# Altium footprint library PcbLib_ICs.PcbLib: 317 footprints (part 23 of 24)
Each footprint in its own frame and in the unit in brackets; x right, y up, seen from the top. Pads: shape width x height; smd on the part's side, far side on the other; paste and mask are expansions set on the pad; w line width, h text height; cw(c..) or ccw(c..) is an arc to the next point about the centre after c.
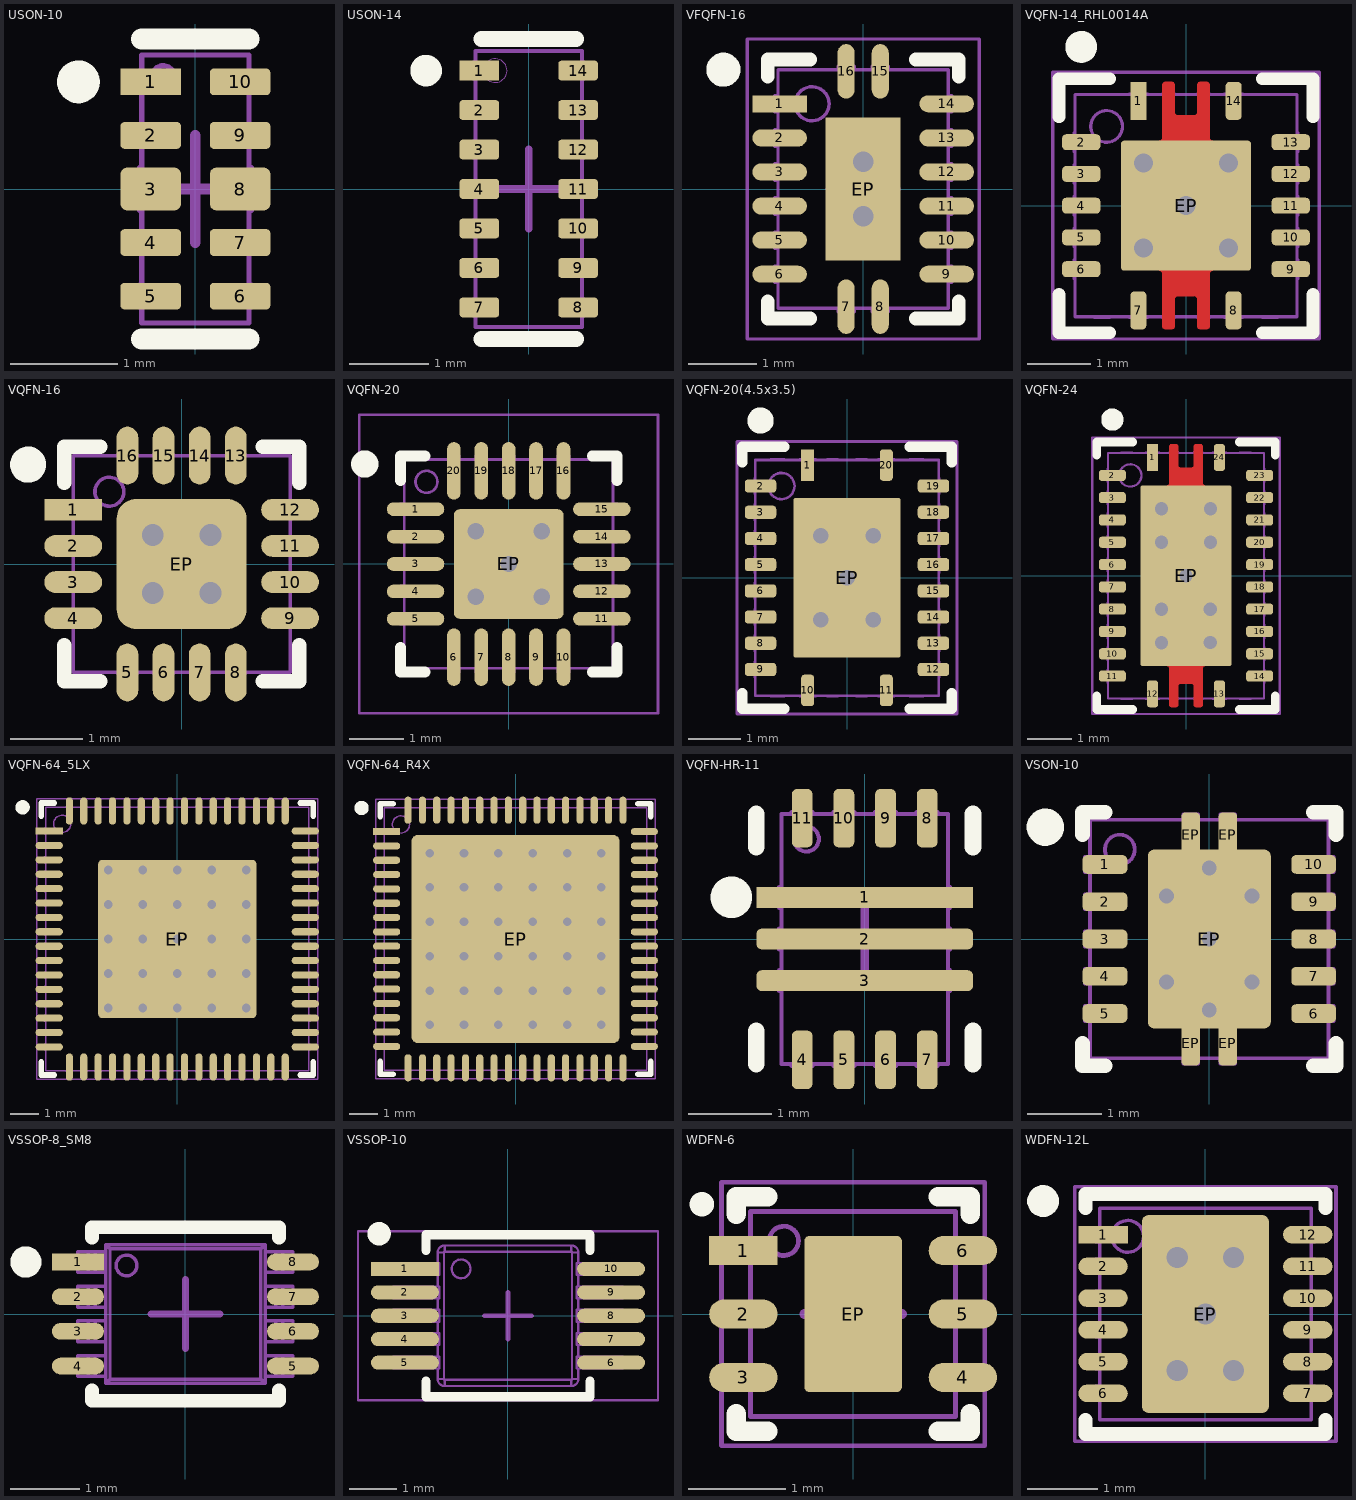
[diagram p22: the footprints below, top view; thin cyan lines are the x and y axes]

## USON-10 [mm] "USON-10 package. Ref DQA0010A TI"
height 0.43
pads (10):
  rect 0.565x0.25 smd paste+0 mask+0.05: 1(-0.417,1)
  rrect30% 0.565x0.25 smd paste+0 mask+0.05: 2(-0.417,0.5) 4(-0.417,-0.5) 5(-0.417,-1) 6(0.417,-1) 7(0.417,-0.5) 9(0.417,0.5) 10(0.417,1)
  rrect30% 0.565x0.4 smd paste+0 mask+0.05: 3(-0.417,0) 8(0.417,0)
Top Overlay:
  circle w0.2: c-1.092,1 r0.1
  lines w0.2: -0.5,-1.4 0.5,-1.4 ; -0.5,1.4 0.5,1.4
Top Assy:
  circle w0.05: c-0.3,1.05 r0.1
  lines w0.05: -0.5,-1.1 -0.52,-1.1 -0.52,-0.9 -0.5,-0.9 ; -0.5,-0.6 -0.52,-0.6 -0.52,-0.4 -0.5,-0.4 ; -0.5,-0.2 -0.52,-0.2 -0.52,0.2 -0.5,0.2 ; -0.5,0.4 -0.52,0.4 -0.52,0.6 -0.5,0.6 ; -0.5,0.9 -0.52,0.9 -0.52,1.1 -0.5,1.1 ; 0.5,-1.1 0.52,-1.1 0.52,-0.9 0.5,-0.9 ; 0.5,-0.6 0.52,-0.6 0.52,-0.4 0.5,-0.4 ; 0.5,-0.2 0.52,-0.2 0.52,0.2 0.5,0.2 ; 0.5,0.4 0.52,0.4 0.52,0.6 0.5,0.6 ; 0.5,0.9 0.52,0.9 0.52,1.1 0.5,1.1 ; -0.5,-1.25 -0.5,1.25 0.5,1.25 0.5,-1.25 -0.5,-1.25
  text ".Designator" at 0.233,-1.719 h1
Top Text:
  lines w0.1: -0.5,0 0.5,0 ; 0,-0.5 0,0.5
3D body "USON-10.STEP": height 0.55, standoff 0, extent -0.52,-1.25 0.52,1.25

## USON-14 [mm] "USON-14 package"
height 0.43
pads (14):
  rect 0.5x0.25 smd paste+0 mask+0.05: 1(-0.625,1.5)
  rrect30% 0.5x0.25 smd paste+0 mask+0.05: 2(-0.625,1) 3(-0.625,0.5) 4(-0.625,0) 5(-0.625,-0.5) 6(-0.625,-1) 7(-0.625,-1.5) 8(0.625,-1.5) 9(0.625,-1) 10(0.625,-0.5) 11(0.625,0) 12(0.625,0.5) 13(0.625,1) 14(0.625,1.5)
Top Overlay:
  circle w0.2: c-1.3,1.5 r0.1
  lines w0.2: -0.6,-1.9 0.6,-1.9 ; -0.6,1.9 0.6,1.9
Top Assy:
  circle w0.013: c-0.425,1.5 r0.15
  lines w0.05: -0.675,-1.6 -0.7,-1.6 -0.7,-1.4 -0.675,-1.4 ; -0.675,-1.1 -0.7,-1.1 -0.7,-0.9 -0.675,-0.9 ; -0.675,-0.6 -0.7,-0.6 -0.7,-0.4 -0.675,-0.4 ; -0.675,-0.1 -0.7,-0.1 -0.7,0.1 -0.675,0.1 ; -0.675,0.4 -0.7,0.4 -0.7,0.6 -0.675,0.6 ; -0.675,0.9 -0.7,0.9 -0.7,1.1 -0.675,1.1 ; -0.675,1.4 -0.7,1.4 -0.7,1.6 -0.675,1.6 ; 0.675,-1.6 0.7,-1.6 0.7,-1.4 0.675,-1.4 ; 0.675,-1.1 0.7,-1.1 0.7,-0.9 0.675,-0.9 ; 0.675,-0.6 0.7,-0.6 0.7,-0.4 0.675,-0.4 ; 0.675,-0.1 0.7,-0.1 0.7,0.1 0.675,0.1 ; 0.675,0.4 0.7,0.4 0.7,0.6 0.675,0.6 ; 0.675,0.9 0.7,0.9 0.7,1.1 0.675,1.1 ; 0.675,1.4 0.7,1.4 0.7,1.6 0.675,1.6 ; -0.675,-1.75 -0.675,1.75 0.675,1.75 0.675,-1.75 -0.675,-1.75
  text ".Designator" at 0.233,-1.719 h1
Top Text:
  lines w0.1: -0.5,0 0.5,0 ; 0,-0.5 0,0.5
3D body "USON-14.STEP": height 0.55, standoff 0, extent -0.7,-1.75 0.7,1.75

## VFQFN-16 [mm] "QFN, 16-Leads, Body 2.50x3.50mm, Pitch 0.50mm, Thermal Pad 1.00x2.00mm, IPC Medium Density"
height 1
pads (17):
  rect 0.8x0.25 smd mask+0.05: 1(-1.225,1.25)
  oval 0.8x0.25 smd mask+0.05: 2(-1.225,0.75) 3(-1.225,0.25) 4(-1.225,-0.25) 5(-1.225,-0.75) 6(-1.225,-1.25) 9(1.225,-1.25) 10(1.225,-0.75) 11(1.225,-0.25) 12(1.225,0.25) 13(1.225,0.75) 14(1.225,1.25)
  oval 0.25x0.8 smd mask+0.05: 7(-0.25,-1.725) 8(0.25,-1.725) 15(0.25,1.725) 16(-0.25,1.725)
  rect 1.1x2.1 smd paste-3 mask+0.05: EP(0,0)
via 0,-0.4 diameter 0.7 hole 0.3
via 0,0.4 diameter 0.7 hole 0.3
Top Overlay:
  circle w0.25: c-2.05,1.75 r0.125
  lines w0.2: -1.4,-1.65 -1.4,-1.9 -0.775,-1.9 ; -1.4,1.65 -1.4,1.9 -0.775,1.9 ; 0.775,-1.9 1.4,-1.9 1.4,-1.65 ; 0.775,1.9 1.4,1.9 1.4,1.65
Top Paste:
  rectangle: -0.6,0.45 -0.1,0.95
  rectangle: 0.1,0.45 0.6,0.95
  region: -0.1,0.25 -0.6,0.25 -0.6,-0.25 -0.1,-0.25
  rectangle: 0.1,-0.25 0.6,0.25
  region: -0.1,-0.45 -0.6,-0.45 -0.6,-0.95 -0.1,-0.95
  rectangle: 0.1,-0.95 0.6,-0.45
Bottom Solder:
  region: -0.75,1.25 -0.25,1.25 0,1 0.25,1.25 0.75,1.25 0.75,0.25 0.5,0 0.75,-0.25 0.75,-1.25 0.25,-1.25 0,-1 -0.25,-1.25 -0.75,-1.25 -0.75,-0.25 -0.5,0 -0.75,0.25
Top Assy:
  circle w0.05: c-0.75,1.25 r0.25
  lines w0.05: -1.25,-1.37 -1.3,-1.37 -1.3,-1.13 -1.25,-1.13 ; -1.25,-0.87 -1.3,-0.87 -1.3,-0.63 -1.25,-0.63 ; -1.25,-0.37 -1.3,-0.37 -1.3,-0.13 -1.25,-0.13 ; -1.25,0.13 -1.3,0.13 -1.3,0.37 -1.25,0.37 ; -1.25,0.63 -1.3,0.63 -1.3,0.87 -1.25,0.87 ; -1.25,1.13 -1.3,1.13 -1.3,1.37 -1.25,1.37 ; -0.37,-1.75 -0.37,-1.8 -0.13,-1.8 -0.13,-1.75 ; -0.37,1.75 -0.37,1.8 -0.13,1.8 -0.13,1.75 ; 0.13,-1.75 0.13,-1.8 0.37,-1.8 0.37,-1.75 ; 0.13,1.75 0.13,1.8 0.37,1.8 0.37,1.75 ; 1.25,-1.37 1.3,-1.37 1.3,-1.13 1.25,-1.13 ; 1.25,-0.87 1.3,-0.87 1.3,-0.63 1.25,-0.63 ; 1.25,-0.37 1.3,-0.37 1.3,-0.13 1.25,-0.13 ; 1.25,0.13 1.3,0.13 1.3,0.37 1.25,0.37 ; 1.25,0.63 1.3,0.63 1.3,0.87 1.25,0.87 ; 1.25,1.13 1.3,1.13 1.3,1.37 1.25,1.37 ; -1.25,-1.75 -1.25,1.75 1.25,1.75 1.25,-1.75 -1.25,-1.75
Top Text:
  lines w0.05: -1.7,-2.2 -1.7,2.2 1.7,2.2 1.7,-2.2 -1.7,-2.2
  lines w0.1: -0.5,0 0.5,0 ; 0,-0.5 0,0.5
3D body "DHVQFN16.STEP": height 0.97, standoff -0.03, extent -1.3,-1.8 1.3,1.8

## VQFN-14_RHL0014A [mm] "VQFN-24 package 5.5x3.5mm with 0.5mm pitch"
height 0.75
pads (15):
  rect 0.25x0.6 smd paste+0 mask+0.05: 1(-0.75,1.65)
  rrect50% 0.6x0.25 smd paste+0 mask+0.05: 2(-1.65,1) 3(-1.65,0.5) 4(-1.65,0) 5(-1.65,-0.5) 6(-1.65,-1) 9(1.65,-1) 10(1.65,-0.5) 11(1.65,0) 12(1.65,0.5) 13(1.65,1)
  rrect50% 0.25x0.6 smd paste+0 mask+0.05: 7(-0.75,-1.65) 8(0.75,-1.65) 14(0.75,1.65)
  rrect5% 2.05x2.05 smd paste-10 mask+0.05: EP(0,0)
via 0.67,-0.67 diameter 0.7 hole 0.3
via -0.67,-0.67 diameter 0.7 hole 0.3
via -0.67,0.67 diameter 0.7 hole 0.3
via 0.67,0.67 diameter 0.7 hole 0.3
via 0,0 diameter 0.7 hole 0.3
Top Layer:
  region: -0.375,1.9 -0.375,1.91 -0.367,1.928 -0.353,1.942 -0.335,1.95 -0.325,1.95 -0.225,1.95 -0.215,1.95 -0.197,1.942 -0.183,1.928 -0.175,1.91 -0.175,1.9 -0.175,1.475 -0.174,1.465 -0.167,1.447 -0.153,1.433 -0.135,1.426 -0.125,1.425 0.125,1.425 0.135,1.426 0.153,1.433 0.167,1.447 0.174,1.465 0.175,1.475 0.175,1.9 0.175,1.91 0.183,1.928 0.197,1.942 0.215,1.95 0.225,1.95 0.325,1.95 0.335,1.95 0.353,1.942 0.367,1.928 0.375,1.91 0.375,1.9 0.375,1.075 0.376,1.065 0.383,1.047 0.397,1.033 0.415,1.026 0.425,1.025 0.425,0.95 -0.425,0.95 -0.425,1.025 -0.415,1.026 -0.397,1.033 -0.383,1.047 -0.376,1.065 -0.375,1.075
  region: 0.375,-1.9 0.375,-1.91 0.367,-1.928 0.353,-1.942 0.335,-1.95 0.325,-1.95 0.225,-1.95 0.215,-1.95 0.197,-1.942 0.183,-1.928 0.175,-1.91 0.175,-1.9 0.175,-1.475 0.174,-1.465 0.167,-1.447 0.153,-1.433 0.135,-1.426 0.125,-1.425 -0.125,-1.425 -0.135,-1.426 -0.153,-1.433 -0.167,-1.447 -0.174,-1.465 -0.175,-1.475 -0.175,-1.9 -0.175,-1.91 -0.183,-1.928 -0.197,-1.942 -0.215,-1.95 -0.225,-1.95 -0.325,-1.95 -0.335,-1.95 -0.353,-1.942 -0.367,-1.928 -0.375,-1.91 -0.375,-1.9 -0.375,-1.075 -0.376,-1.065 -0.383,-1.047 -0.397,-1.033 -0.415,-1.026 -0.425,-1.025 -0.425,-0.95 0.425,-0.95 0.425,-1.025 0.415,-1.026 0.397,-1.033 0.383,-1.047 0.376,-1.065 0.375,-1.075
Top Overlay:
  circle w0.25: c-1.65,2.5 r0.125
  lines w0.2: -2,-1.4 -2,-2 -1.2,-2 ; -2,1.4 -2,2 -1.2,2 ; 1.2,-2 2,-2 2,-1.4 ; 1.2,2 2,2 2,1.4
Top Paste:
  rectangle: -0.25,-0.25 0.25,0.25
  rectangle: 0.45,-0.25 0.95,0.25
  region: -0.45,0.25 -0.95,0.25 -0.95,-0.25 -0.45,-0.25
  rectangle: -0.25,0.45 0.25,0.95
  rectangle: 0.45,0.45 0.95,0.95
  region: -0.45,0.95 -0.95,0.95 -0.95,0.45 -0.45,0.45
  region: 0.25,-0.45 -0.25,-0.45 -0.25,-0.95 0.25,-0.95
  region: -0.45,-0.45 -0.95,-0.45 -0.95,-0.95 -0.45,-0.95
  rectangle: 0.45,-0.95 0.95,-0.45
  region: -0.375,-1.9 -0.375,-1.91 -0.367,-1.928 -0.353,-1.942 -0.335,-1.95 -0.325,-1.95 -0.225,-1.95 -0.215,-1.95 -0.197,-1.942 -0.183,-1.928 -0.175,-1.91 -0.175,-1.9 -0.175,-1.4 -0.175,-1.39 -0.183,-1.372 -0.197,-1.358 -0.215,-1.35 -0.225,-1.35 -0.325,-1.35 -0.335,-1.35 -0.353,-1.358 -0.367,-1.372 -0.375,-1.39 -0.375,-1.4
  region: 0.375,-1.9 0.375,-1.91 0.367,-1.928 0.353,-1.942 0.335,-1.95 0.325,-1.95 0.225,-1.95 0.215,-1.95 0.197,-1.942 0.183,-1.928 0.175,-1.91 0.175,-1.9 0.175,-1.4 0.175,-1.39 0.183,-1.372 0.197,-1.358 0.215,-1.35 0.225,-1.35 0.325,-1.35 0.335,-1.35 0.353,-1.358 0.367,-1.372 0.375,-1.39 0.375,-1.4
  region: 0.375,1.9 0.375,1.91 0.367,1.928 0.353,1.942 0.335,1.95 0.325,1.95 0.225,1.95 0.215,1.95 0.197,1.942 0.183,1.928 0.175,1.91 0.175,1.9 0.175,1.4 0.175,1.39 0.183,1.372 0.197,1.358 0.215,1.35 0.225,1.35 0.325,1.35 0.335,1.35 0.353,1.358 0.367,1.372 0.375,1.39 0.375,1.4
  region: -0.375,1.9 -0.375,1.91 -0.367,1.928 -0.353,1.942 -0.335,1.95 -0.325,1.95 -0.225,1.95 -0.215,1.95 -0.197,1.942 -0.183,1.928 -0.175,1.91 -0.175,1.9 -0.175,1.4 -0.175,1.39 -0.183,1.372 -0.197,1.358 -0.215,1.35 -0.225,1.35 -0.325,1.35 -0.335,1.35 -0.353,1.358 -0.367,1.372 -0.375,1.39 -0.375,1.4
Top Solder:
  region: 0.225,-2 0.205,-2 0.168,-1.985 0.14,-1.957 0.125,-1.92 0.125,-1.9 0.125,-1.5 0.125,-1.495 0.121,-1.486 0.114,-1.479 0.105,-1.475 0.1,-1.475 -0.1,-1.475 -0.105,-1.475 -0.114,-1.479 -0.121,-1.486 -0.125,-1.495 -0.125,-1.5 -0.125,-1.9 -0.125,-1.92 -0.14,-1.957 -0.168,-1.985 -0.205,-2 -0.225,-2 -0.35,-2 -0.365,-2 -0.392,-1.989 -0.414,-1.967 -0.425,-1.94 -0.425,-1.925 -0.425,-1.15 -0.426,-1.135 -0.438,-1.108 -0.458,-1.088 -0.485,-1.076 -0.5,-1.075 -0.5,-1 0.5,-1 0.501,-1.075 0.486,-1.076 0.459,-1.087 0.438,-1.108 0.426,-1.135 0.425,-1.15 0.425,-1.925 0.425,-1.94 0.414,-1.967 0.392,-1.989 0.365,-2 0.35,-2
  region: -0.225,2 -0.205,2 -0.168,1.985 -0.14,1.957 -0.125,1.92 -0.125,1.9 -0.125,1.5 -0.125,1.495 -0.121,1.486 -0.114,1.479 -0.105,1.475 -0.1,1.475 0.1,1.475 0.105,1.475 0.114,1.479 0.121,1.486 0.125,1.495 0.125,1.5 0.125,1.9 0.125,1.92 0.14,1.957 0.168,1.985 0.205,2 0.225,2 0.35,2 0.365,2 0.392,1.989 0.414,1.967 0.425,1.94 0.425,1.925 0.425,1.15 0.426,1.135 0.438,1.108 0.458,1.088 0.485,1.076 0.5,1.075 0.5,1 -0.5,1 -0.501,1.075 -0.486,1.076 -0.459,1.087 -0.438,1.108 -0.426,1.135 -0.425,1.15 -0.425,1.925 -0.425,1.94 -0.414,1.967 -0.392,1.989 -0.365,2 -0.35,2
Bottom Solder:
  region: -1.2,1.2 -0.3,1.2 0,0.9 0.3,1.2 1.2,1.2 1.2,0.3 0.9,0 1.2,-0.3 1.2,-1.2 0.301,-1.2 0,-0.9 -0.3,-1.2 -1.2,-1.2 -1.2,-0.3 -0.9,0 -1.2,0.3
Top Assy:
  circle w0.05: c-1.25,1.248 r0.25
  lines w0.05: -1.75,-1.15 -1.76,-1.15 -1.76,-0.85 -1.75,-0.85 ; -1.75,-0.65 -1.76,-0.65 -1.76,-0.35 -1.75,-0.35 ; -1.75,-0.15 -1.76,-0.15 -1.76,0.15 -1.75,0.15 ; -1.75,0.35 -1.76,0.35 -1.76,0.65 -1.75,0.65 ; -1.75,0.85 -1.76,0.85 -1.76,1.15 -1.75,1.15 ; -1.45,-1.76 -1.2,-1.76 -1.2,-1.75 ; -0.9,-1.75 -0.9,-1.76 -0.6,-1.76 -0.6,-1.75 ; -0.9,1.75 -0.9,1.76 -0.6,1.76 -0.6,1.75 ; -0.375,-1.75 -0.375,-1.76 -0.175,-1.76 -0.175,-1.75 ; -0.375,1.75 -0.375,1.76 -0.175,1.76 -0.175,1.75 ; 0.175,-1.75 0.175,-1.76 0.375,-1.76 0.375,-1.75 ; 0.175,1.75 0.175,1.76 0.375,1.76 0.375,1.75 ; 0.6,-1.75 0.6,-1.76 0.9,-1.76 0.9,-1.75 ; 0.6,1.75 0.6,1.76 0.9,1.76 0.9,1.75 ; 1.2,-1.75 1.2,-1.76 1.45,-1.76 1.45,-1.75 ; 1.75,-1.15 1.76,-1.15 1.76,-0.85 1.75,-0.85 ; 1.75,-0.65 1.76,-0.65 1.76,-0.35 1.75,-0.35 ; 1.75,-0.15 1.76,-0.15 1.76,0.15 1.75,0.15 ; 1.75,0.35 1.76,0.35 1.76,0.65 1.75,0.65 ; 1.75,0.85 1.76,0.85 1.76,1.15 1.75,1.15 ; -1.75,-1.75 -1.75,1.75 1.75,1.75 1.75,-1.75 -1.75,-1.75
  text ".Designator" at 0.467,-3.443 h2
Top Text:
  lines w0.05: -2.1,-2.1 -2.1,2.1 2.1,2.1 2.1,-2.1 -2.1,-2.1
  lines w0.1: -0.5,0 0.5,0 ; 0,-0.5 0,0.5
3D body "VQFN-14_RHL0014A_.STEP": height 1.05, standoff 0, extent -1.775,-1.775 1.775,1.775

## VQFN-16 [mm] "VQFN-16 package 3 x 3mm with 0.5mm pitch"
pads (17):
  rect 0.8x0.3 smd paste+0 mask+0.05: 1(-1.5,0.75)
  oval 0.8x0.3 smd paste+0 mask+0.05: 2(-1.5,0.25) 3(-1.5,-0.25) 4(-1.5,-0.75) 9(1.5,-0.75) 10(1.5,-0.25) 11(1.5,0.25) 12(1.5,0.75)
  oval 0.3x0.8 smd paste+0 mask+0.05: 5(-0.75,-1.5) 6(-0.25,-1.5) 7(0.25,-1.5) 8(0.75,-1.5) 13(0.75,1.5) 14(0.25,1.5) 15(-0.25,1.5) 16(-0.75,1.5)
  rrect30% 1.8x1.8 smd paste-50 mask+0.05: EP(0,0)
via -0.4,-0.4 diameter 0.7 hole 0.3
via 0.4,-0.4 diameter 0.7 hole 0.3
via -0.4,0.4 diameter 0.7 hole 0.3
via 0.4,0.4 diameter 0.7 hole 0.3
Top Overlay:
  circle w0.25: c-2.125,1.375 r0.125
  lines w0.2: -1.625,-1.125 -1.625,-1.625 -1.125,-1.625 ; -1.625,1.125 -1.625,1.625 -1.125,1.625 ; 1.125,-1.625 1.625,-1.625 1.625,-1.125 ; 1.125,1.625 1.625,1.625 1.625,1.125
Top Paste:
  region: -0.45,0.45 -0.45,0.95 -0.95,0.95 -0.95,0.45
  region: 0.25,0.45 0.25,0.95 -0.25,0.95 -0.25,0.45
  region: 0.95,0.45 0.95,0.95 0.45,0.95 0.45,0.45
  rectangle: 0.45,-0.95 0.95,-0.45
  rectangle: 0.45,-0.25 0.95,0.25
  rectangle: -0.95,-0.95 -0.45,-0.45
  rectangle: -0.25,-0.95 0.25,-0.45
  rectangle: -0.95,-0.25 -0.45,0.25
  rectangle: -0.25,-0.25 0.25,0.25
Bottom Solder:
  region: -1,1 -0.3,1 0,0.7 0.3,1 1,1 1,0.3 0.7,0 1,-0.3 1,-1 0.3,-1 0,-0.7 -0.3,-1 -1,-1 -1,-0.3 -0.7,0 -1,0.3
Top Assy:
  circle w0.05: c-1,1 r0.2
  lines w0.05: -1.5,-0.875 -1.521,-0.875 -1.521,-0.625 -1.5,-0.625 ; -1.5,-0.375 -1.521,-0.375 -1.521,-0.125 -1.5,-0.125 ; -1.5,0.125 -1.521,0.125 -1.521,0.375 -1.5,0.375 ; -1.5,0.625 -1.521,0.625 -1.521,0.875 -1.5,0.875 ; -0.875,-1.5 -0.875,-1.521 -0.625,-1.521 -0.625,-1.5 ; -0.875,1.5 -0.875,1.521 -0.625,1.521 -0.625,1.5 ; -0.375,-1.5 -0.375,-1.521 -0.125,-1.521 -0.125,-1.5 ; -0.375,1.5 -0.375,1.521 -0.125,1.521 -0.125,1.5 ; 0.125,-1.5 0.125,-1.521 0.375,-1.521 0.375,-1.5 ; 0.125,1.5 0.125,1.521 0.375,1.521 0.375,1.5 ; 0.625,-1.5 0.625,-1.521 0.875,-1.521 0.875,-1.5 ; 0.625,1.5 0.625,1.521 0.875,1.521 0.875,1.5 ; 1.5,-0.875 1.521,-0.875 1.521,-0.625 1.5,-0.625 ; 1.5,-0.375 1.521,-0.375 1.521,-0.125 1.5,-0.125 ; 1.5,0.125 1.521,0.125 1.521,0.375 1.5,0.375 ; 1.5,0.625 1.521,0.625 1.521,0.875 1.5,0.875 ; -1.5,-1.5 1.5,-1.5 1.5,1.5 -1.5,1.5 -1.5,-1.5
  text ".Designator" at -2.579,-0.349 h1.5
Top Text:
  lines w0.1: -0.5,0 0.5,0 ; 0,-0.5 0,0.5
3D body "VQFN-16(3x3).STEP": height 1, standoff 0, extent -1.51,-1.51 1.51,1.51

## VQFN-20 [mm] "VQFN-20 package 3.5 x 3.5mm with 0.5mm pitch"
height 1
pads (21):
  oval 1.05x0.25 smd paste+0 mask+0.05: 1(-1.7,1) 2(-1.7,0.5) 3(-1.7,0) 4(-1.7,-0.5) 5(-1.7,-1) 11(1.7,-1) 12(1.7,-0.5) 13(1.7,0) 14(1.7,0.5) 15(1.7,1)
  oval 0.25x1.05 smd paste+0 mask+0.05: 6(-1,-1.7) 7(-0.5,-1.7) 8(0,-1.7) 9(0.5,-1.7) 10(1,-1.7) 16(1,1.7) 17(0.5,1.7) 18(0,1.7) 19(-0.5,1.7) 20(-1,1.7)
  rrect10% 2x2 smd paste-50 mask+0.05: EP(0,0)
via 0,0 diameter 0.7 hole 0.3
via -0.6,0.6 diameter 0.7 hole 0.3
via 0.6,0.6 diameter 0.7 hole 0.3
via -0.6,-0.6 diameter 0.7 hole 0.3
via 0.6,-0.6 diameter 0.7 hole 0.3
Top Overlay:
  circle w0.25: c-2.625,1.825 r0.125
  lines w0.2: -1.975,-1.525 -1.975,-1.975 -1.525,-1.975 ; -1.975,1.525 -1.975,1.975 -1.525,1.975 ; 1.525,-1.975 1.975,-1.975 1.975,-1.525 ; 1.525,1.975 1.975,1.975 1.975,1.525
Top Paste:
  region: 0.25,0.45 0.25,0.95 -0.25,0.95 -0.25,0.45
  region: 0.95,0.45 0.95,0.95 0.45,0.95 0.45,0.45
  region: -0.45,0.45 -0.45,0.95 -0.95,0.95 -0.95,0.45
  region: 0.25,-0.25 0.25,0.25 -0.25,0.25 -0.25,-0.25
  region: 0.95,-0.25 0.95,0.25 0.45,0.25 0.45,-0.25
  region: -0.45,-0.25 -0.45,0.25 -0.95,0.25 -0.95,-0.25
  region: -0.25,-0.45 -0.25,-0.95 0.25,-0.95 0.25,-0.45
  region: -0.95,-0.45 -0.95,-0.95 -0.45,-0.95 -0.45,-0.45
  region: 0.45,-0.45 0.45,-0.95 0.95,-0.95 0.95,-0.45
Bottom Solder:
  region: -1.2,1.2 -0.3,1.2 0,0.9 0.3,1.2 1.2,1.2 1.2,0.3 0.9,0 1.2,-0.3 1.2,-1.2 0.3,-1.2 0,-0.9 -0.3,-1.2 -1.2,-1.2 -1.2,-0.3 -0.9,0 -1.2,0.3
Top Assy:
  circle w0.05: c-1.5,1.5 r0.2
  lines w0.05: -1.905,-1.1 -1.975,-1.1 -1.975,-0.9 -1.905,-0.9 ; -1.905,-0.6 -1.975,-0.6 -1.975,-0.4 -1.905,-0.4 ; -1.905,-0.1 -1.975,-0.1 -1.975,0.1 -1.905,0.1 ; -1.905,0.4 -1.975,0.4 -1.975,0.6 -1.905,0.6 ; -1.905,0.9 -1.975,0.9 -1.975,1.1 -1.905,1.1 ; -1.1,-1.905 -1.1,-1.975 -0.9,-1.975 -0.9,-1.905 ; -1.1,1.905 -1.1,1.975 -0.9,1.975 -0.9,1.905 ; -0.6,-1.905 -0.6,-1.975 -0.4,-1.975 -0.4,-1.905 ; -0.6,1.905 -0.6,1.975 -0.4,1.975 -0.4,1.905 ; -0.1,-1.905 -0.1,-1.975 0.1,-1.975 0.1,-1.905 ; -0.1,1.905 -0.1,1.975 0.1,1.975 0.1,1.905 ; 0.4,-1.905 0.4,-1.975 0.6,-1.975 0.6,-1.905 ; 0.4,1.905 0.4,1.975 0.6,1.975 0.6,1.905 ; 0.9,-1.905 0.9,-1.975 1.1,-1.975 1.1,-1.905 ; 0.9,1.905 0.9,1.975 1.1,1.975 1.1,1.905 ; 1.905,-1.1 1.975,-1.1 1.975,-0.9 1.905,-0.9 ; 1.905,-0.6 1.975,-0.6 1.975,-0.4 1.905,-0.4 ; 1.905,-0.1 1.975,-0.1 1.975,0.1 1.905,0.1 ; 1.905,0.4 1.975,0.4 1.975,0.6 1.905,0.6 ; 1.905,0.9 1.975,0.9 1.975,1.1 1.905,1.1 ; -1.905,-1.905 1.905,-1.905 1.905,1.905 -1.905,1.905 -1.905,-1.905
  text ".Designator" at -3.443,-0.467 h2
Top Text:
  lines w0.05: -2.725,-2.725 2.725,-2.725 2.725,2.725 -2.725,2.725 -2.725,-2.725
  lines w0.1: -0.5,0 0.5,0 ; 0,-0.5 0,0.5
3D body "VQFN-20.step": height 1, standoff 0, extent -1.905,-1.905 1.905,1.905

## VQFN-20(4.5x3.5) [mm] "VQFN-20 package 4.5x3.5mm with 0.5mm pitch"
height 0.75
pads (21):
  rect 0.25x0.6 smd paste+0 mask+0.05: 1(-0.75,2.15)
  rrect50% 0.6x0.25 smd paste+0 mask+0.05: 2(-1.65,1.75) 3(-1.65,1.25) 4(-1.65,0.75) 5(-1.65,0.25) 6(-1.65,-0.25) 7(-1.65,-0.75) 8(-1.65,-1.25) 9(-1.65,-1.75) 12(1.65,-1.75) 13(1.65,-1.25) 14(1.65,-0.75) 15(1.65,-0.25) 16(1.65,0.25) 17(1.65,0.75) 18(1.65,1.25) 19(1.65,1.75)
  rrect50% 0.25x0.6 smd paste+0 mask+0.05: 10(-0.75,-2.15) 11(0.75,-2.15) 20(0.75,2.15)
  rrect5% 2.05x3.05 smd paste-10 mask+0.05: EP(0,0)
via 0,0 diameter 0.7 hole 0.3
via 0.5,-0.8 diameter 0.7 hole 0.3
via -0.5,-0.8 diameter 0.7 hole 0.3
via 0.5,0.8 diameter 0.7 hole 0.3
via -0.5,0.8 diameter 0.7 hole 0.3
Top Overlay:
  circle w0.25: c-1.65,3 r0.125
  lines w0.2: -2,-2.2 -2,-2.5 -1.2,-2.5 ; -2,2.2 -2,2.5 -1.2,2.5 ; 1.2,-2.5 2,-2.5 2,-2.2 ; 1.2,2.5 2,2.5 2,2.2
Top Paste:
  rectangle: -0.25,0.8 0.25,1.3
  rectangle: 0.45,0.8 0.95,1.3
  region: -0.45,1.3 -0.95,1.3 -0.95,0.8 -0.45,0.8
  region: 0.25,0.6 -0.25,0.6 -0.25,0.1 0.25,0.1
  region: -0.45,0.6 -0.95,0.6 -0.95,0.1 -0.45,0.1
  rectangle: 0.45,0.1 0.95,0.6
  region: 0.25,-0.1 -0.25,-0.1 -0.25,-0.6 0.25,-0.6
  region: -0.45,-0.1 -0.95,-0.1 -0.95,-0.6 -0.45,-0.6
  rectangle: 0.45,-0.6 0.95,-0.1
  region: 0.25,-0.8 -0.25,-0.8 -0.25,-1.3 0.25,-1.3
  region: -0.45,-0.8 -0.95,-0.8 -0.95,-1.3 -0.45,-1.3
  rectangle: 0.45,-1.3 0.95,-0.8
Bottom Solder:
  region: -1.2,1.5 -0.3,1.5 0,1.2 0.3,1.5 1.2,1.5 1.2,0.3 0.9,0 1.2,-0.3 1.2,-1.5 0.3,-1.5 0,-1.2 -0.3,-1.5 -1.2,-1.5 -1.2,-0.3 -0.9,0 -1.2,0.3
Top Assy:
  circle w0.05: c-1.25,1.75 r0.25
  lines w0.05: -1.75,-1.9 -1.76,-1.9 -1.76,-1.6 -1.75,-1.6 ; -1.75,-1.4 -1.76,-1.4 -1.76,-1.1 -1.75,-1.1 ; -1.75,-0.9 -1.76,-0.9 -1.76,-0.6 -1.75,-0.6 ; -1.75,-0.4 -1.76,-0.4 -1.76,-0.1 -1.75,-0.1 ; -1.75,0.1 -1.76,0.1 -1.76,0.4 -1.75,0.4 ; -1.75,0.6 -1.76,0.6 -1.76,0.9 -1.75,0.9 ; -1.75,1.1 -1.76,1.1 -1.76,1.4 -1.75,1.4 ; -1.75,1.6 -1.76,1.6 -1.76,1.9 -1.75,1.9 ; -1.45,-2.25 -1.45,-2.26 -1.2,-2.26 -1.2,-2.25 ; -1.45,2.25 -1.45,2.26 -1.2,2.26 -1.2,2.25 ; -0.9,-2.25 -0.9,-2.26 -0.6,-2.26 -0.6,-2.25 ; -0.9,2.25 -0.9,2.26 -0.6,2.26 -0.6,2.25 ; -0.375,-2.25 -0.375,-2.26 -0.175,-2.26 -0.175,-2.25 ; -0.375,2.25 -0.375,2.26 -0.175,2.26 -0.175,2.25 ; 0.175,-2.25 0.175,-2.26 0.375,-2.26 0.375,-2.25 ; 0.175,2.25 0.175,2.26 0.375,2.26 0.375,2.25 ; 0.6,-2.25 0.6,-2.26 0.9,-2.26 0.9,-2.25 ; 0.6,2.25 0.6,2.26 0.9,2.26 0.9,2.25 ; 1.2,-2.25 1.2,-2.26 1.45,-2.26 1.45,-2.25 ; 1.2,2.25 1.2,2.26 1.45,2.26 1.45,2.25 ; 1.75,-1.9 1.76,-1.9 1.76,-1.6 1.75,-1.6 ; 1.75,-1.4 1.76,-1.4 1.76,-1.1 1.75,-1.1 ; 1.75,-0.9 1.76,-0.9 1.76,-0.6 1.75,-0.6 ; 1.75,-0.4 1.76,-0.4 1.76,-0.1 1.75,-0.1 ; 1.75,0.1 1.76,0.1 1.76,0.4 1.75,0.4 ; 1.75,0.6 1.76,0.6 1.76,0.9 1.75,0.9 ; 1.75,1.1 1.76,1.1 1.76,1.4 1.75,1.4 ; 1.75,1.6 1.76,1.6 1.76,1.9 1.75,1.9 ; -1.75,-2.25 -1.75,2.248 1.75,2.248 1.75,-2.25 -1.75,-2.25
  text ".Designator" at 0.467,-3.443 h2
Top Text:
  lines w0.05: -2.1,-2.6 -2.1,2.6 2.1,2.6 2.1,-2.6 -2.1,-2.6
  lines w0.1: -0.5,0 0.5,0 ; 0,-0.5 0,0.5
3D body "VQFN-20.STEP": height 1, standoff 0, extent -1.76,-2.26 1.76,2.26
